# Altium footprint library Conectors.PcbLib: 123 footprints (part 1 of 8)
Each footprint in its own frame and in the unit in brackets; x right, y up, seen from the top. Pads: shape width x height; smd on the part's side, far side on the other; paste and mask are expansions set on the pad; w line width, h text height; cw(c..) or ccw(c..) is an arc to the next point about the centre after c.
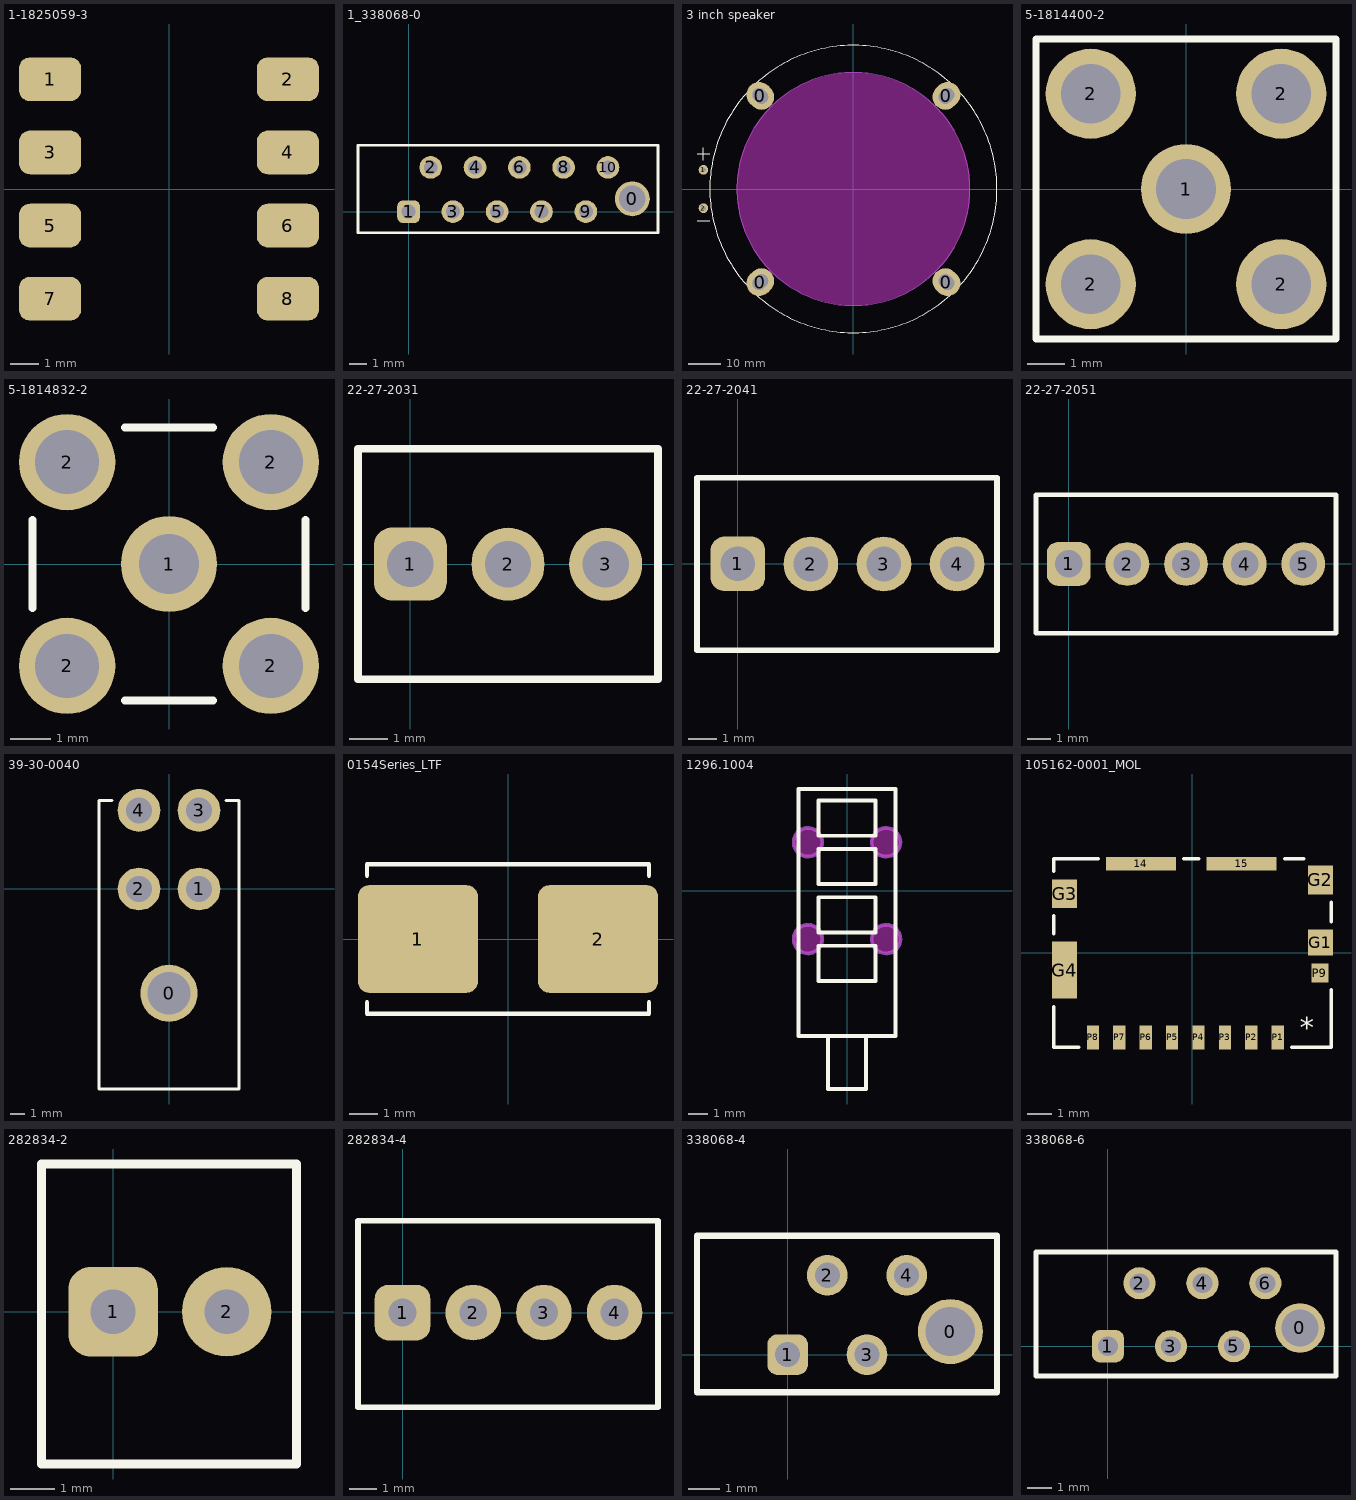
[diagram p0: the footprints below, top view; thin cyan lines are the x and y axes]

## 1-1825059-3 [mm]
pads (8):
  rrect50% 2.16x1.52 smd: 1(-4.13,3.81) 2(4.13,3.81) 3(-4.13,1.27) 4(4.13,1.27) 5(-4.13,-1.27) 6(4.13,-1.27) 7(-4.13,-3.81) 8(4.13,-3.81)
3D body "c-1-1825059-3-b-3d.stp": height 4.5, standoff 0.05, extent -4.659,-6.07 4.659,6.071

## 1_338068-0 [mm]
pads (11):
  round 2 hole 1.5: 0(12.827,0.737)
  rrect50% 1.3x1.3 hole 0.8: 1(0,0)
  round 1.3 hole 0.8: 2(1.27,2.54) 3(2.54,0) 4(3.81,2.54) 5(5.08,0) 6(6.35,2.54) 7(7.62,0) 8(8.89,2.54) 9(10.16,0) 10(11.43,2.54)
Top Overlay:
  lines w0.152: -2.9,-1.2 14.3,-1.2 14.3,3.8 -2.9,3.8 -2.9,-1.2
3D body "c-1-338068-0-f-3d.stp": height 4, standoff -3.1, extent -2.885,-1.2 14.285,3.8

## 3 inch speaker [mm]
pads (6):
  oval 9x8 hole 4.2 slot 5.2 at 45 deg rot 45: 0(-29.168,-29.168) 0(29.168,29.168)
  oval 9x8 hole 4.2 slot 5.2 at 135 deg rot 135: 0(-29.168,29.168) 0(29.168,-29.168)
  round 3 hole 1.5: 1(-47,6) 2(-47,-6)
Top Overlay:
  circle w0.2: c0,0 r45
  lines w0.2: -49,-10 -45,-10 ; -49,11 -45,11 ; -47,9 -47,13
Keep-Out Layer:
  board cut-out: -36.5,0 -36.5,-0.896 -36.412,-2.686 -36.236,-4.469 -35.973,-6.242 -35.624,-8 -35.188,-9.738 -34.668,-11.453 -34.064,-13.14 -33.379,-14.796 -32.613,-16.416 -31.768,-17.996 -30.846,-19.533 -29.851,-21.023 -28.783,-22.463 -27.646,-23.848 -26.443,-25.176 -25.176,-26.443 -23.848,-27.646 -22.463,-28.783 -21.023,-29.851 -19.533,-30.846 -17.996,-31.768 -16.416,-32.613 -14.796,-33.379 -13.14,-34.064 -11.453,-34.668 -9.738,-35.188 -8,-35.624 -6.242,-35.973 -4.469,-36.236 -2.686,-36.412 -0.896,-36.5 0,-36.5 0.896,-36.5 2.686,-36.412 4.469,-36.236 6.242,-35.973 8,-35.624 9.738,-35.188 11.453,-34.668 13.14,-34.064 14.796,-33.379 16.416,-32.613 17.996,-31.768 19.533,-30.846 21.023,-29.851 22.463,-28.783 23.848,-27.646 25.176,-26.443 26.443,-25.176 27.646,-23.848 28.783,-22.463 29.851,-21.023 30.846,-19.533 31.768,-17.996 32.613,-16.416 33.379,-14.796 34.064,-13.14 34.668,-11.453 35.188,-9.738 35.624,-8 35.973,-6.242 36.236,-4.469 36.412,-2.686 36.5,-0.896 36.5,0 36.5,0.896 36.412,2.686 36.236,4.469 35.973,6.242 35.624,8 35.188,9.738 34.668,11.453 34.064,13.14 33.379,14.796 32.613,16.416 31.768,17.996 30.846,19.533 29.851,21.023 28.783,22.463 27.646,23.848 26.443,25.176 25.176,26.443 23.848,27.646 22.463,28.783 21.023,29.851 19.533,30.846 17.996,31.768 16.416,32.613 14.796,33.379 13.14,34.064 11.453,34.668 9.738,35.188 8,35.624 6.242,35.973 4.469,36.236 2.686,36.412 0.896,36.5 0,36.5 -0.896,36.5 -2.686,36.412 -4.469,36.236 -6.242,35.973 -8,35.624 -9.738,35.188 -11.453,34.668 -13.14,34.064 -14.796,33.379 -16.416,32.613 -17.996,31.768 -19.533,30.846 -21.023,29.851 -22.463,28.783 -23.848,27.646 -25.176,26.443 -26.443,25.176 -27.646,23.848 -28.783,22.463 -29.851,21.023 -30.846,19.533 -31.768,17.996 -32.613,16.416 -33.379,14.796 -34.064,13.14 -34.668,11.453 -35.188,9.738 -35.624,8 -35.973,6.242 -36.236,4.469 -36.412,2.686 -36.5,0.896
Mechanical 5:
  circle w0.2: c0,0 r36.5

## 5-1814400-2 [mm]
pads (5):
  round 2.4 hole 1.6: 1(0,0) 2(-2.54,-2.54) 2(-2.54,2.54) 2(2.54,-2.54) 2(2.54,2.54)
Top Overlay:
  lines w0.2: -4,-4 4,-4 4,4 -4,4 -4,-4
3D body "c-5-1814400-2-d-3d.stp": height 10.43, standoff -3.1, extent -3.15,-11.05 3.15,3.15

## 5-1814832-2 [mm]
pads (5):
  round 2.4 hole 1.5: 1(0,0)
  round 2.4 hole 1.6: 2(-2.54,-2.54) 2(-2.54,2.54) 2(2.54,-2.54) 2(2.54,2.54)
Top Overlay:
  lines w0.2: -3.4,-1.1 -3.4,1.1 ; -1.1,-3.4 1.1,-3.4 ; -1.1,3.4 1.1,3.4 ; 3.4,-1.1 3.4,1.1
3D body "c-5-1814832-2-c-3d.stp": height 9.5, standoff -4, extent -3.2,-3.2 3.2,3.2

## 22-27-2031 [mm]
pads (3):
  rrect50% 1.9x1.9 hole 1.2: 1(0,0)
  round 1.9 hole 1.2: 2(2.54,-0.005) 3(5.08,-0.005)
Top Overlay:
  lines w0.2: -1.36,-3 -1.36,3 6.44,3 6.44,-3 -1.36,-3
3D body "022272031.stp": height 11.72, standoff -3.54, extent -1.27,-2.905 6.35,2.895

## 22-27-2041 [mm]
pads (4):
  rrect50% 1.9x1.9 hole 1.2: 1(0,0)
  round 1.9 hole 1.2: 2(2.54,-0.005) 3(5.08,-0.005) 4(7.62,-0.005)
Top Overlay:
  lines w0.2: -1.42,-3.005 9.01,-3.005 9.01,2.995 -1.42,2.995 -1.42,-3.005
3D body "022272041.stp": height 10.12, standoff -5.14, extent -1.27,-2.9 8.89,2.9

## 22-27-2051 [mm]
pads (5):
  rrect50% 1.9x1.9 hole 1.2: 1(0,0)
  round 1.9 hole 1.2: 2(2.54,-0.005) 3(5.08,-0.005) 4(7.62,-0.005) 5(10.16,-0.005)
Top Overlay:
  lines w0.2: -1.42,-3.005 11.58,-3.005 11.58,2.995 -1.42,2.995 -1.42,-3.005
3D body "022272051.stp": height 11.72, standoff -3.54, extent -1.27,-2.905 11.43,2.895

## 39-30-0040 [mm]
pads (5):
  round 4 hole 3: 0(0,-7.3)
  round 3 hole 1.8: 1(2.1,0) 2(-2.1,0) 3(2.1,5.5) 4(-2.1,5.5)
Top Overlay:
  lines w0.2: -4,6.2 -4.9,6.2 -4.9,-14 4.9,-14 4.9,6.2 4,6.2
3D body "039300040.stp": height 11.4, standoff -3.6, extent -4.8,-13.9 5.2,6.035

## 0154Series_LTF [mil]
pads (2):
  rrect20% 167x150 smd: 1(-125.5,0) 2(125.5,0)
Top Overlay:
  lines w6: -196.5,-88.1 -196.5,-104 196.5,-104 196.5,-88.1 ; -196.5,88.1 -196.5,104 196.5,104 196.5,88.1
3D body "0154Series_LTF.step": height 152.01, standoff 0, extent -191.5,-99.02 191.5,99.01

## 1296.1004 [mm]
Top Overlay:
  lines w0.2: -1,-7.7 -1,-10.4 1,-10.4 1,-7.7 ; -2.54,-7.62 -2.54,5.334 2.54,5.334 2.54,-7.62 -2.54,-7.62 ; -1.5,-4.735 -1.5,-2.885 1.5,-2.885 1.5,-4.735 -1.5,-4.735 ; -1.5,-2.195 -1.5,-0.345 1.5,-0.345 1.5,-2.195 -1.5,-2.195 ; -1.5,0.345 -1.5,2.195 1.5,2.195 1.5,0.345 -1.5,0.345 ; -1.5,2.885 -1.5,4.735 1.5,4.735 1.5,2.885 -1.5,2.885
Keep-Out Layer:
  board cut-out: 1.3,-2.54 1.3,-2.614 1.329,-2.759 1.385,-2.895 1.467,-3.018 1.572,-3.123 1.695,-3.205 1.831,-3.261 1.976,-3.29 2.05,-3.29 2.124,-3.29 2.269,-3.261 2.405,-3.205 2.528,-3.123 2.633,-3.018 2.715,-2.895 2.771,-2.759 2.8,-2.614 2.8,-2.54 2.8,-2.466 2.771,-2.321 2.715,-2.185 2.633,-2.062 2.528,-1.957 2.405,-1.875 2.269,-1.819 2.124,-1.79 2.05,-1.79 1.976,-1.79 1.831,-1.819 1.695,-1.875 1.572,-1.957 1.467,-2.062 1.385,-2.185 1.329,-2.321 1.3,-2.466
  board cut-out: -2.8,-2.54 -2.8,-2.614 -2.771,-2.759 -2.715,-2.895 -2.633,-3.018 -2.528,-3.123 -2.405,-3.205 -2.269,-3.261 -2.124,-3.29 -2.05,-3.29 -1.976,-3.29 -1.831,-3.261 -1.695,-3.205 -1.572,-3.123 -1.467,-3.018 -1.385,-2.895 -1.329,-2.759 -1.3,-2.614 -1.3,-2.54 -1.3,-2.466 -1.329,-2.321 -1.385,-2.185 -1.467,-2.062 -1.572,-1.957 -1.695,-1.875 -1.831,-1.819 -1.976,-1.79 -2.05,-1.79 -2.124,-1.79 -2.269,-1.819 -2.405,-1.875 -2.528,-1.957 -2.633,-2.062 -2.715,-2.185 -2.771,-2.321 -2.8,-2.466
  board cut-out: -2.8,2.54 -2.8,2.466 -2.771,2.321 -2.715,2.185 -2.633,2.062 -2.528,1.957 -2.405,1.875 -2.269,1.819 -2.124,1.79 -2.05,1.79 -1.976,1.79 -1.831,1.819 -1.695,1.875 -1.572,1.957 -1.467,2.062 -1.385,2.185 -1.329,2.321 -1.3,2.466 -1.3,2.54 -1.3,2.614 -1.329,2.759 -1.385,2.895 -1.467,3.018 -1.572,3.123 -1.695,3.205 -1.831,3.261 -1.976,3.29 -2.05,3.29 -2.124,3.29 -2.269,3.261 -2.405,3.205 -2.528,3.123 -2.633,3.018 -2.715,2.895 -2.771,2.759 -2.8,2.614
  board cut-out: 1.3,2.54 1.3,2.466 1.329,2.321 1.385,2.185 1.467,2.062 1.572,1.957 1.695,1.875 1.831,1.819 1.976,1.79 2.05,1.79 2.124,1.79 2.269,1.819 2.405,1.875 2.528,1.957 2.633,2.062 2.715,2.185 2.771,2.321 2.8,2.466 2.8,2.54 2.8,2.614 2.771,2.759 2.715,2.895 2.633,3.018 2.528,3.123 2.405,3.205 2.269,3.261 2.124,3.29 2.05,3.29 1.976,3.29 1.831,3.261 1.695,3.205 1.572,3.123 1.467,3.018 1.385,2.895 1.329,2.759 1.3,2.614
Mechanical 5:
  circle w0.2: c2.05,-2.54 r0.75
  circle w0.2: c-2.05,-2.54 r0.75
  circle w0.2: c-2.05,2.54 r0.75
  circle w0.2: c2.05,2.54 r0.75
3D body "Mentor_1296_1004.STEP": height 11.13, standoff -3.1, extent -2.45,-10.4 2.45,5.3

## 105162-0001_MOL [mil]
pads (15):
  rect 115x22 smd: 14(-84.45,146.35) 15(80.51,146.35)
  rect 41x43 smd: G1(209.65,17.02)
  rect 41x47 smd: G2(209.65,119.78) G3(-209.64,97.33)
  rect 41x94 smd: G4(-209.65,-28.06)
  rect 20x39 smd: P1(139.76,-138.49) P2(96.46,-138.49) P3(53.15,-138.49) P4(9.84,-138.49) P5(-33.46,-138.49) P6(-76.77,-138.49) P7(-120.08,-138.49) P8(-163.39,-138.49)
  rect 28x31 smd: P9(209.06,-32.98)
Top Overlay:
  lines w6: -227.5,-88.16 -227.5,-154.5 -186.49,-154.5 ; -227.5,32.04 -227.5,60.73 ; -227.5,133.93 -227.5,154.5 -155.05,154.5 ; -13.85,154.5 9.91,154.5 ; -5,154.5 5,154.5 ; 151.11,154.5 182.39,154.5 ; 162.86,-154.5 227.5,-154.5 227.5,-60.8 ; 227.5,51.62 227.5,83.18
  text "*" at 176.38,-151.18 h59.06
3D body "1051620001.stp": height 58.46, standoff 1.38, extent -222.44,-149.6 222.45,149.61

## 282834-2 [mm]
pads (2):
  rrect50% 2x2 hole 1: 1(0,0)
  round 2 hole 1: 2(2.54,0)
Top Overlay:
  lines w0.2: -1.6,-3.4 4.1,-3.4 4.1,3.3 -1.6,3.3 -1.6,-3.4
3D body "c-282834-2-c-3d.stp": height 10, standoff -3.4, extent -1.5,-3.275 4.04,3.225

## 282834-4 [mm]
pads (4):
  rrect50% 2x2 hole 1: 1(0,0)
  round 2 hole 1: 2(2.54,0) 3(5.08,0) 4(7.62,0)
Top Overlay:
  lines w0.2: -1.6,-3.4 -1.6,3.3 9.18,3.3 9.18,-3.4 -1.6,-3.4
3D body "c-282834-4-c-3d.stp": height 10, standoff -3.4, extent -1.5,-3.29 9.12,3.21

## 338068-4 [mm]
pads (5):
  round 2.083 hole 1.575: 0(5.207,0.737)
  rrect50% 1.3x1.3 hole 0.8: 1(0,0)
  round 1.3 hole 0.8: 2(1.27,2.54) 3(2.54,0) 4(3.81,2.54)
Top Overlay:
  lines w0.2: -2.9,-1.2 -2.9,3.8 6.7,3.8 6.7,-1.2 -2.9,-1.2
3D body "c-338068-4-f-3d.stp": height 4, standoff -3.1, extent -2.885,-1.23 6.665,3.77

## 338068-6 [mm]
pads (7):
  round 2 hole 1.5: 0(7.747,0.737)
  rrect50% 1.3x1.3 hole 0.8: 1(0,0)
  round 1.3 hole 0.8: 2(1.27,2.54) 3(2.54,0) 4(3.81,2.54) 5(5.08,0) 6(6.35,2.54)
Top Overlay:
  lines w0.2: -2.9,-1.2 9.2,-1.2 9.2,3.8 -2.9,3.8 -2.9,-1.2
3D body "c-338068-6-f-3d.stp": height 4, standoff -3.1, extent -2.855,-1.23 9.235,3.77